# Altium footprint library Custom1.PcbLib: 554 footprints (part 12 of 35)
Each footprint in its own frame and in the unit in brackets; x right, y up, seen from the top. Pads: shape width x height; smd on the part's side, far side on the other; paste and mask are expansions set on the pad; w line width, h text height; cw(c..) or ccw(c..) is an arc to the next point about the centre after c.
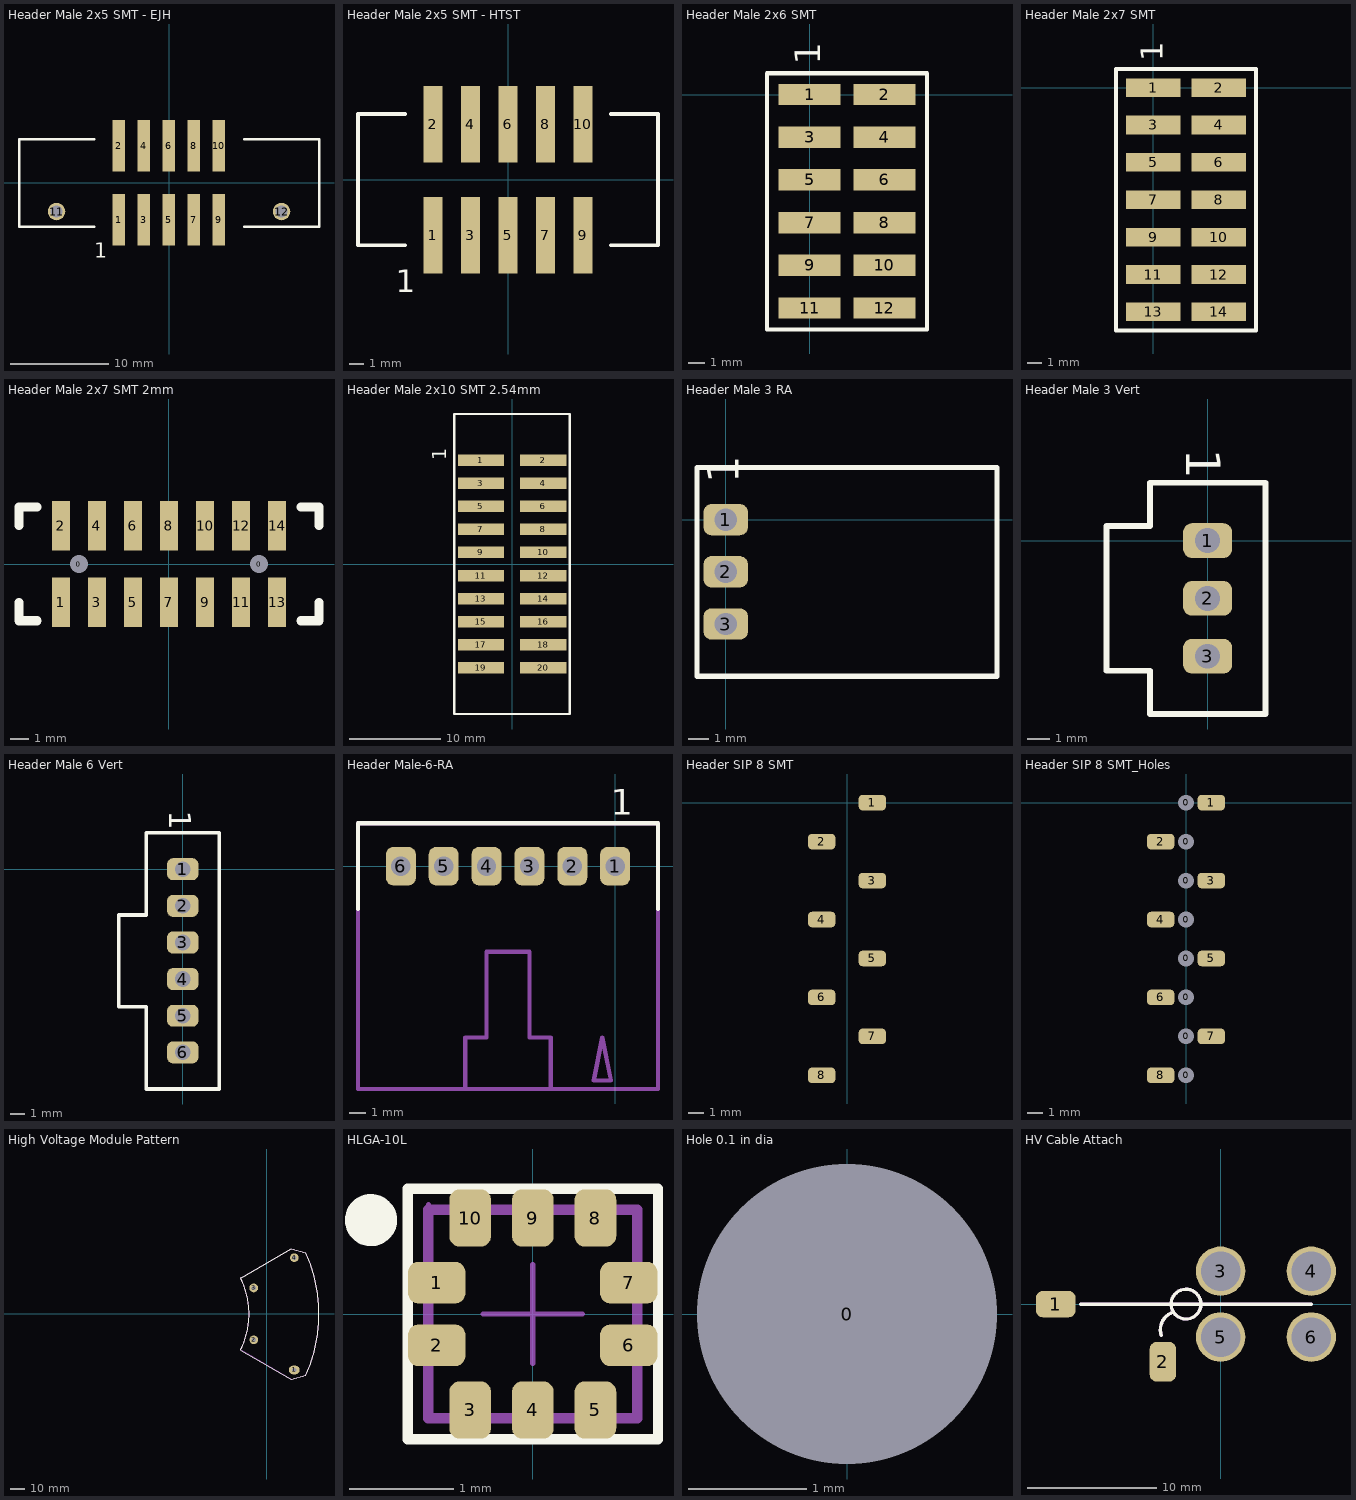
[diagram p11: the footprints below, top view; thin cyan lines are the x and y axes]

## Header Male 2x5 SMT - EJH [mil]
height 230
pads (12):
  rect 50x205 smd: 1(-200.01,-148) 2(-200.01,148) 3(-100.01,-148) 4(-100.01,148) 5(-0.01,-148) 6(-0.01,148) 7(99.99,-148) 8(99.99,148) 9(199.99,-148) 10(199.99,148)
  round 70 hole 47: 11(-450,-115)
  round 70 hole 47 unplated: 12(450,-115)
Top Overlay:
  lines w10: -300,-175 -600,-175 -600,175 -300,175 ; 300,-175 600,-175 600,175 300,175
  text "1" at -300,-300 h60
3D body "EJH-105-02-L-D-SM-LC.stp": height 690.5, standoff -54.5, extent -655,-233.5 660,233.5

## Header Male 2x5 SMT - HTST [mil]
height 230
pads (10):
  rect 50x205 smd: 1(-200.01,-148) 2(-200.01,148) 3(-100.01,-148) 4(-100.01,148) 5(-0.01,-148) 6(-0.01,148) 7(99.99,-148) 8(99.99,148) 9(199.99,-148) 10(199.99,148)
Top Overlay:
  lines w10: -275,-175 -400,-175 -400,175 -275,175 ; 275,-175 400,-175 400,175 275,175
  text "1" at -300,-300 h60
3D body "HTST-105-01-S-DV.stp": height 400.5, standoff 0.5, extent -400,-215 400,225
3D body: height 233.5, standoff -233.5, extent -275,25 -275,25

## Header Male 2x6 SMT [mil]
height 230
pads (12):
  rect 145x50 smd: 1(0,0) 2(175,0) 3(0,-100) 4(175,-100) 5(0,-200) 6(175,-200) 7(0,-300) 8(175,-300) 9(0,-400) 10(175,-400) 11(0,-500) 12(175,-500)
Top Overlay:
  lines w10: -100,-550 -100,50 275,50 275,-550 -100,-550
  text "1" at 25,70 h60
3D body "015910120.stp": height 380.5, standoff 0.5, extent -50,-550 225,50

## Header Male 2x7 SMT [mil]
height 230
pads (14):
  rect 145x50 smd: 1(0,0) 2(175,0) 3(0,-100) 4(175,-100) 5(0,-200) 6(175,-200) 7(0,-300) 8(175,-300) 9(0,-400) 10(175,-400) 11(0,-500) 12(175,-500) 13(0,-600) 14(175,-600)
Top Overlay:
  lines w10: -100,-650 -56.25,-650 -9.38,-650 84.38,-650 131.25,-650 275,-650 275,50 -100,50 -100,-650
  text "1" at 25,70 h60
3D body "015910140.stp": height 380.5, standoff 0.5, extent -49.99,-650 225.01,50

## Header Male 2x7 SMT 2mm [mm] "CONN HEADER SMD 14POS 2MM"
pads (16):
  round 0.5 hole 1 unplated: 0(-5,0) 0(5,0)
  rect 1x2.75 smd paste-0.1: 1(-6,-2.125) 2(-6,2.125) 3(-4,-2.125) 4(-4,2.125) 5(-2,-2.125) 6(-2,2.125) 7(0,-2.125) 8(0,2.125) 9(2,-2.125) 10(2,2.125) 11(4,-2.125) 12(4,2.125) 13(6,-2.125) 14(6,2.125)
Top Overlay:
  lines w0.5: -8.325,-2.15 -8.325,-3.15 -7.325,-3.15 ; -8.325,2.15 -8.325,3.15 -7.325,3.15 ; 7.325,-3.15 8.325,-3.15 8.325,-2.15 ; 7.325,3.15 8.325,3.15 8.325,2.15
3D body "878321420.stp": height 7.61, standoff -0.74, extent -8.325,-3.15 8.325,3.15

## Header Male 2x10 SMT 2.54mm [mil]
height 230
pads (20):
  rect 200x50 smd: 1(-135,450) 2(135,450) 3(-135,350) 4(135,350) 5(-135,250) 6(135,250) 7(-135,150) 8(135,150) 9(-135,50) 10(135,50) 11(-135,-50) 12(135,-50) 13(-135,-150) 14(135,-150) 15(-135,-250) 16(135,-250) 17(-135,-350) 18(135,-350) 19(-135,-450) 20(135,-450)
Top Overlay:
  lines w10: -250,-650 -250,650 250,650 250,-650 -250,-650
  text "1" at -285,450 h60

## Header Male 3 RA [mil]
height 275
pads (3):
  rrect50% 85x60 hole 43: 1(0,0) 2(0,-100) 3(0,-200)
Top Overlay:
  lines w10: -55,-300 -55,100 520,100 520,-300 -55,-300
  text "1" at 25,70 h60

## Header Male 3 Vert [mil]
height 275
pads (3):
  rrect50% 85x60 hole 43: 1(0,0) 2(0,-100) 3(0,-200)
Top Overlay:
  lines w10: -175,-225 -100,-225 -100,-300 100,-300 100,100 -100,100 -100,25 -175,25 -175,-225
  text "1" at -37,159 h60
3D body: height 2, standoff 0.75, extent -175,-300 100,100

## Header Male 6 Vert [mil]
height 275
pads (6):
  rrect50% 85x60 hole 43: 1(0,0) 2(0,-100) 3(0,-200) 4(0,-300) 5(0,-400) 6(0,-500)
Top Overlay:
  lines w10: -175,-375 -100,-375 -100,-600 100,-600 100,100 -100,100 -100,-125 -175,-125 -175,-375
  text "1" at -37,159 h60
3D body: height 2, standoff 0.75, extent -175,-600 100,100

## Header Male-6-RA [mil]
pads (6):
  rrect50% 70x90 hole 45: 1(0,0) 2(-100,0) 3(-200,0) 4(-300,0) 5(-400,0) 6(-500,0)
Top Overlay:
  lines w10: -600,-100 -600,100 100,100 100,-100
  text "1" at -10,120 h60
Mechanical 15:
  lines w10: -350,-520 -350,-400 -300,-400 -300,-200 -200,-200 -200,-400 -150,-400 -150,-520 ; -600,-520 -600,100 100,100 100,-520 -600,-520 ; -50,-500 -10,-500 -30,-400 -50,-500
3D body "705530005.STEP": height 280, standoff -125, extent -600,-507.5 100,27.5

## Header SIP 8 SMT [mil]
height 300
pads (8):
  rrect50% 70x40 smd: 1(65,0) 2(-65,-100) 3(65,-200) 4(-65,-300) 5(65,-400) 6(-65,-500) 7(65,-600) 8(-65,-700)
3D body: height 300, standoff 2, extent -50,-800 50,50

## Header SIP 8 SMT_Holes [mil]
height 300
pads (16):
  round 30 hole 40 unplated: 0(0,-700) 0(0,-600) 0(0,-500) 0(0,-400) 0(0,-300) 0(0,-200) 0(0,-100) 0(0,0)
  rrect50% 70x40 smd: 1(65,0) 2(-65,-100) 3(65,-200) 4(-65,-300) 5(65,-400) 6(-65,-500) 7(65,-600) 8(-65,-700)
3D body: height 300, standoff 2, extent -50,-800 50,50

## High Voltage Module Pattern [mil]
pads (4):
  oval 300x240 hole 120: 1(762,-1545.51)
  round 240 hole 120: 2(-353,-714.51) 3(-354.33,716.54) 4(765.75,1552.17)
Top Overlay:
  lines w10: -718.69,-993.74 ccw(c-2690.74,-0.82) -718.69,992.09 ; -718.09,-995.93 678.36,-1802.23 1081.91,-1694.36 ccw(c-2690.14,-3.02) 1081.9,1688.33 ; -718.09,989.89 678.36,1796.19 1081.91,1688.32
Mechanical 15:
  circle w10: c-354.01,-717.01 r48.34
  circle w10: c-354.01,716.85 r48.34
  circle w10: c762.13,-1544.96 r48.34
  circle w10: c762.13,1544.8 r48.34
  region: -402.35,-717.01 -402.35,-721.77 -400.49,-731.11 -396.85,-739.91 -391.56,-747.82 -384.82,-754.56 -376.91,-759.85 -368.11,-763.49 -358.77,-765.35 -354.01,-765.35 -349.25,-765.35 -339.91,-763.49 -331.11,-759.85 -323.19,-754.56 -316.46,-747.82 -311.17,-739.91 -307.53,-731.11 -305.67,-721.77 -305.67,-717.01 -305.67,-712.25 -307.53,-702.91 -311.17,-694.11 -316.46,-686.19 -323.19,-679.46 -331.11,-674.17 -339.91,-670.53 -349.25,-668.67 -354.01,-668.67 -358.77,-668.67 -368.11,-670.53 -376.91,-674.17 -384.82,-679.46 -391.56,-686.19 -396.85,-694.11 -400.49,-702.91 -402.35,-712.25
  lines w10: -718.69,-993.74 ccw(c-2690.74,-0.82) -718.69,992.09 677.76,1798.39 1081.31,1690.52 cw(c-2690.74,-0.82) 1081.31,-1692.16 677.76,-1800.03 -718.69,-993.73
3D body "HVS-3.step": height 950.08, standoff 0.5, extent -733.15,-1770.66 1428.7,1827.77

## HLGA-10L [mm] "2.0 x 2.0 x 0.76 mm typ.)"
pads (10):
  rrect50% 0.55x0.4 smd mask+0.05: 1(-0.92,0.3) 2(-0.92,-0.3) 6(0.92,-0.3) 7(0.92,0.3)
  rrect50% 0.4x0.55 smd mask+0.05: 3(-0.6,-0.92) 4(0,-0.92) 5(0.6,-0.92) 8(0.6,0.92) 9(0,0.92) 10(-0.6,0.92)
Top Overlay:
  circle w0.25: c-1.55,0.9 r0.125
  lines w0.1: -1.2,-1.2 -1.2,1.2 1.2,1.2 1.2,-1.2 -1.2,-1.2
Mechanical 13:
  lines w0.1: -1,-1 -1,1 1,1 1,-1 -1,-1
Mechanical 15:
  lines w0.05: -1,1 1,1 1,-1 -1,-1 -1,1.05 ; -0.475,0 0.475,0 ; 0,-0.475 0,0.475
3D body: height 0.85, standoff 0, extent -1.02,-1 0.98,1

## Hole 0.1 in dia [mil]
pads (1):
  round 60 hole 100: 0(0,0)

## HV Cable Attach [mil]
pads (6):
  rrect50% 120x80 smd: 1(-500,0)
  rrect50% 80x120 smd: 2(-175,-175)
  round 150 hole 120: 3(0,100) 4(275,100) 5(0,-100) 6(275,-100)
Top Overlay:
  circle w10: c-105,0 r45.28
  lines w10: -425,0 275,0 ; -180,-95 cw(c-127.5,-77.5) -145,-25
Mechanical 15:
  circle w10: c-105,0 r45.28
  lines w10: -425,0 275,0 ; -180,-95 cw(c-127.5,-77.5) -145,-25